# Altium footprint library RoBeast_PCB_Library.PcbLib: 71 footprints (part 3 of 5)
Each footprint in its own frame and in the unit in brackets; x right, y up, seen from the top. Pads: shape width x height; smd on the part's side, far side on the other; paste and mask are expansions set on the pad; w line width, h text height; cw(c..) or ccw(c..) is an arc to the next point about the centre after c.
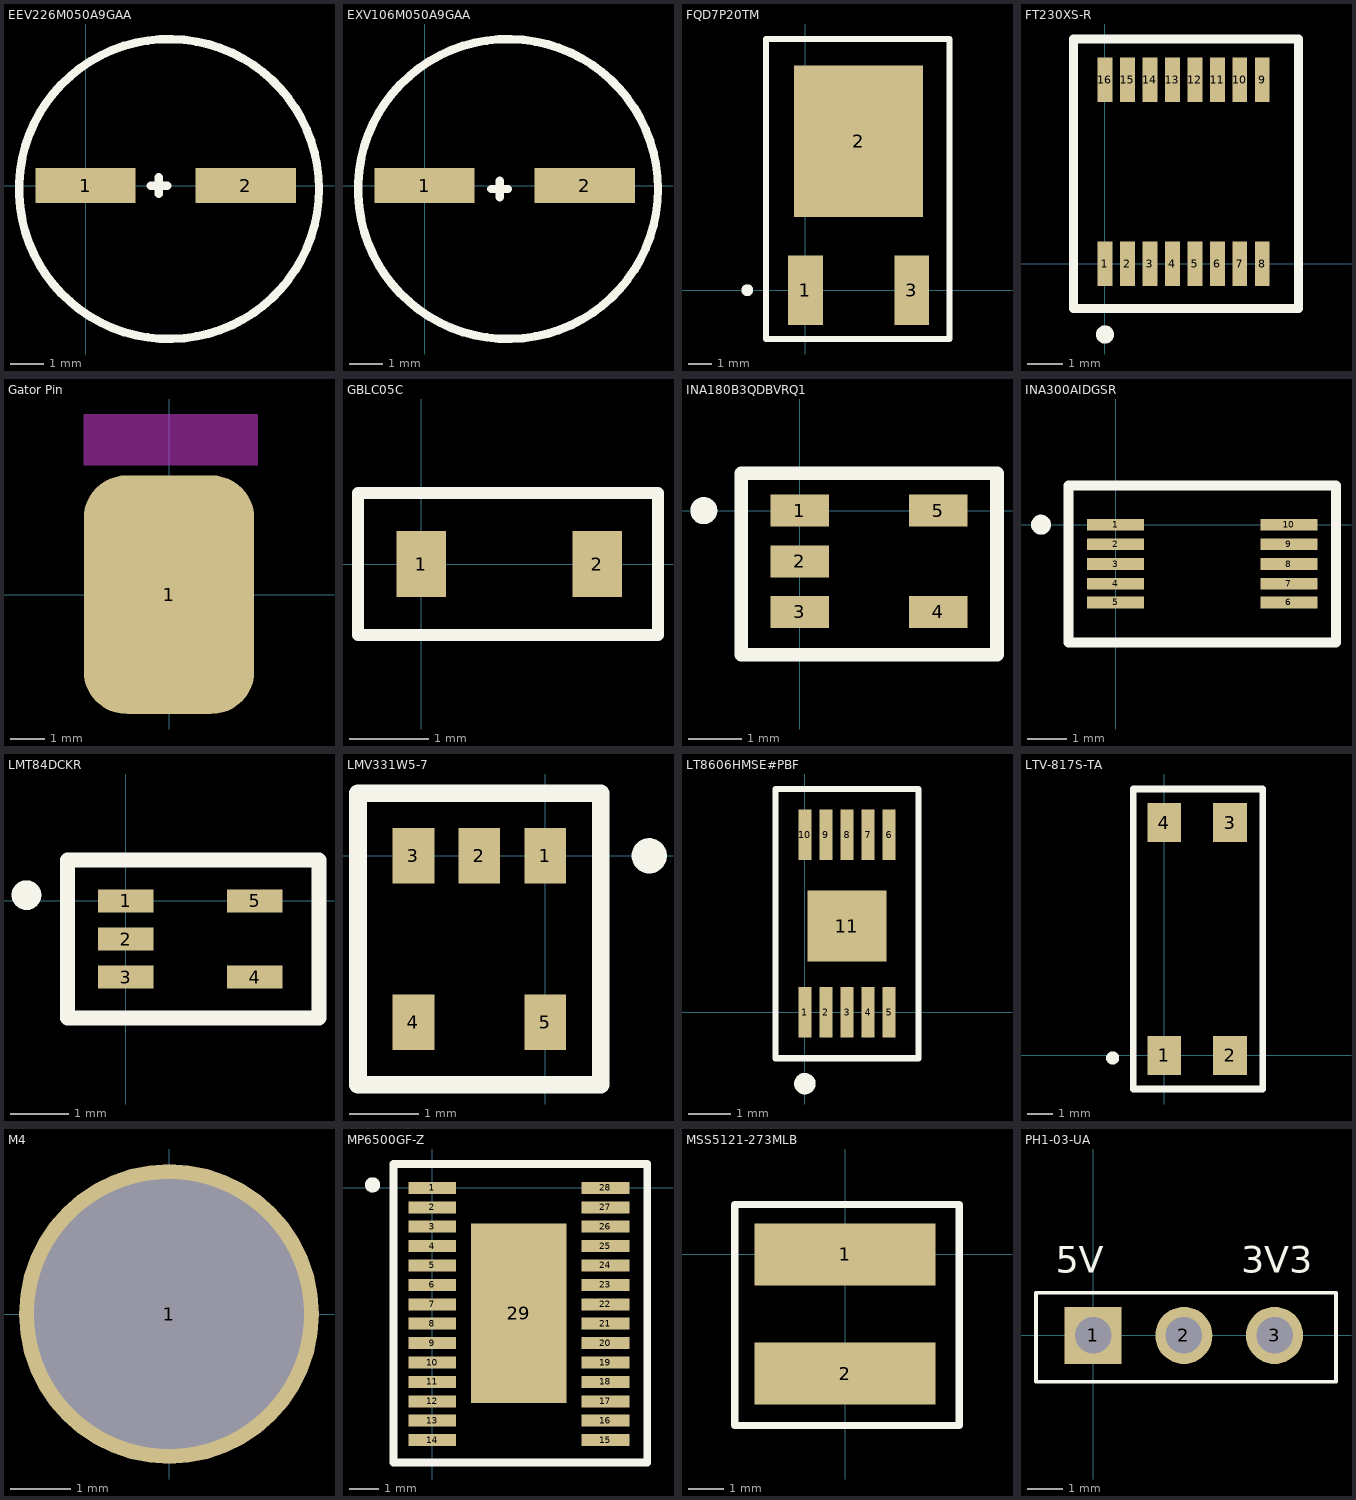
[diagram p2: the footprints below, top view; thin cyan lines are the x and y axes]

## EEV226M050A9GAA [mm]
pads (2):
  rect 3x1.05 smd: 1(0,0) 2(4.8,0)
Top Overlay:
  circle w0.254: c2.5,-0.1 r4.494
  lines w0.254: 1.95,0 2.45,0 ; 2.2,-0.25 2.2,0.25
3D body "EEV226M050A9GAA.step": height 5.36, standoff -0.3, extent -1.414,-3.377 6.186,3.423

## EXV106M050A9GAA [mm]
pads (2):
  rect 3x1.05 smd: 1(0,0) 2(4.8,0)
Top Overlay:
  circle w0.254: c2.5,-0.1 r4.494
  lines w0.254: 2,-0.1 2.5,-0.1 ; 2.25,-0.35 2.25,0.15
3D body "EXV106M050A9GAA.step": height 5.66, standoff 0, extent -1.4,-3.4 6.2,3.4

## FQD7P20TM [mm]
pads (3):
  rect 1.5x3 smd: 1(0,0) 3(4.572,0)
  rect 5.55x6.5 smd: 2(2.286,6.4)
Top Overlay:
  circle w0.254: c-2.5,0 r0.127
  lines w0.254: -1.7,-2.1 6.2,-2.1 6.2,10.8 -1.7,10.8 -1.7,-2.1
3D body "DPAK-4_6P22X6P73_ONS.step": height 2.49, standoff 0.05, extent -1.066,-1.303 5.666,10.191

## FT230XS-R [mm]
pads (16):
  rect 0.42x1.25 smd mask+0.051: 1(0,0) 2(0.635,0) 3(1.27,0) 4(1.905,0) 5(2.54,0) 6(3.175,0) 7(3.81,0) 8(4.445,0) 9(4.445,5.2) 10(3.81,5.2) 11(3.175,5.2) 12(2.54,5.2) 13(1.905,5.2) 14(1.27,5.2) 15(0.635,5.2) 16(0,5.2)
Top Overlay:
  circle w0.254: c0,-2 r0.127
  lines w0.254: -0.889,-1.27 5.469,-1.27 5.469,6.35 -0.889,6.35 -0.889,-1.27
3D body "SOIC_30XS-R_FTD.step": height 1.76, standoff 0, extent -0.252,-0.549 4.752,5.649

## Gator Pin [mm]
pads (1):
  rrect50% 5x7 smd: 1(0,0)
Keep-Out Layer:
  board cut-out: -2.5,3.8 -2.5,5.3 2.6,5.3 2.6,3.8

## GBLC05C [mm]
pads (2):
  rect 0.63x0.83 smd: 1(0,0) 2(2.23,0)
Top Overlay:
  lines w0.15: -0.8,-0.9 -0.8,0.9 3,0.9 3,-0.9 -0.8,-0.9
3D body "ZMV829BTA.STEP": height 1.2, standoff 0, extent -0.15,-0.65 2.35,0.65

## INA180B3QDBVRQ1 [mm]
pads (5):
  rect 1.1x0.6 smd mask+0.102: 1(0,0) 2(0,-0.95) 3(0,-1.9) 4(2.6,-1.9) 5(2.6,0)
Top Overlay:
  circle w0.254: c-1.8,0 r0.127
  lines w0.254: -1.1,-2.7 3.7,-2.7 3.7,0.7 -1.1,0.7 -1.1,-2.7
3D body "DBV0005A.stp": height 1.2, standoff 0, extent -0.073,-2.399 2.727,0.501

## INA300AIDGSR [mm]
pads (10):
  rect 1.45x0.3 smd mask+0.051: 1(0,0) 2(0,-0.5) 3(0,-1) 4(0,-1.5) 5(-0.002,-1.976) 6(4.4,-1.976) 7(4.4,-1.5) 8(4.4,-1) 9(4.4,-0.5) 10(4.4,0)
Top Overlay:
  circle w0.254: c-1.9,0 r0.127
  lines w0.254: -1.2,-3 -1.2,1 5.6,1 5.6,-3 -1.2,-3
3D body "DGS0010A.stp": height 1.06, standoff -0.04, extent -0.238,-2.493 4.687,0.507

## LMT84DCKR [mm]
pads (5):
  rect 0.95x0.4 smd mask+0.07: 1(0,0) 2(0,-0.65) 3(0,-1.3) 4(2.2,-1.3) 5(2.2,0)
Top Overlay:
  circle w0.254: c-1.7,0.1 r0.127
  lines w0.254: -1,-2 -1,0.7 3.3,0.7 3.3,-2 -1,-2
3D body "DCK0005A.stp": height 1, standoff 0, extent 0.049,-1.654 2.149,0.346

## LMV331W5-7 [mm]
pads (5):
  rect 0.6x0.8 smd: 1(0,0) 2(-0.95,0) 3(-1.9,0) 4(-1.9,-2.4) 5(0,-2.4)
Top Overlay:
  circle w0.254: c1.5,0 r0.127
  lines w0.254: -2.7,-3.3 0.8,-3.3 0.8,0.9 -2.7,0.9 -2.7,-3.3
3D body "SOT25_DIO.step": height 1.45, standoff 0, extent -2.48,-2.731 0.62,0.269

## LT8606HMSE#PBF [mm]
pads (11):
  rect 0.305x1.2 smd mask+0.045: 1(0,0) 2(0.5,0) 3(1,0) 4(1.5,0) 5(2,0) 6(2,4.211) 7(1.5,4.211) 8(1,4.211) 9(0.5,4.211) 10(0,4.211)
  rect 1.88x1.68 smd mask+0.049: 11(0.998,2.044)
Top Overlay:
  circle w0.254: c0,-1.7 r0.127
  lines w0.15: -0.7,-1.1 -0.7,5.3 2.7,5.3 2.7,-1.1 -0.7,-1.1
3D body "MSE_10_ADI.step": height 1.7, standoff 0, extent -0.498,-0.427 2.5,4.627

## LTV-817S-TA [mm]
pads (4):
  rect 1.3x1.5 smd: 1(0,0) 2(2.54,0) 3(2.54,9) 4(0,9)
Top Overlay:
  circle w0.254: c-2,-0.1 r0.127
  lines w0.254: -1.2,-1.3 -1.2,10.3 3.8,10.3 3.8,-1.3 -1.2,-1.3
3D body "PC817XI.STEP": height 4, standoff 0, extent -1.023,-0.333 3.557,9.417

## M4 [mm]
pads (1):
  round 5 hole 4.5: 1(0,0)
3D body "???_83.STEP": height 4, standoff -18, extent -3.6,-3.4 3.376,3.6

## MP6500GF-Z [mm]
pads (29):
  rect 1.6x0.4 smd mask+0.051: 1(0,0) 2(0,-0.65) 3(0,-1.3) 4(0,-1.95) 5(0,-2.6) 6(0,-3.25) 7(0,-3.9) 8(0,-4.55) 9(0,-5.2) 10(0,-5.85) 11(0,-6.5) 12(0,-7.15) 13(0,-7.8) 14(0,-8.45) 15(5.8,-8.45) 16(5.8,-7.8) 17(5.8,-7.15) 18(5.8,-6.5) 19(5.8,-5.85) 20(5.8,-5.2) 21(5.8,-4.55) 22(5.8,-3.9) 23(5.8,-3.25) 24(5.8,-2.6) 25(5.8,-1.95) 26(5.8,-1.3) 27(5.8,-0.65) 28(5.8,0)
  rect 3.2x6 smd mask+0.051: 29(2.9,-4.2)
Top Overlay:
  circle w0.254: c-2,0.1 r0.127
  lines w0.254: -1.3,-9.2 7.2,-9.2 7.2,0.8 -1.3,0.8 -1.3,-9.2
3D body "HTSSOP28_4P4X9P7_TEX.step": height 1.2, standoff 0, extent -0.199,-9.051 5.999,0.651

## MSS5121-273MLB [mm]
pads (2):
  rect 5.08x1.74 smd: 1(0,0) 2(0,-3.34)
Top Overlay:
  lines w0.2: -3.1,-4.8 -3.1,1.4 3.2,1.4 3.2,-4.8 -3.1,-4.8
3D body "LQH5BPB1R0NT0L.STEP": height 2.2, standoff 0, extent -2.5,-4.2 2.5,0.8

## PH1-03-UA [mm]
pads (3):
  rect 1.6x1.6 hole 1.02: 1(0,0)
  round 1.6 hole 1.02: 2(2.54,0) 3(5.08,0)
Top Overlay:
  lines w0.1: -1.6,-1.3 6.8,-1.3 6.8,1.2 -1.6,1.2 -1.6,-1.3
  text "5V" at -1.05,1.75 h0.75
  text "3V3" at 4.15,1.75 h0.75
3D body "PH1-03-UA.STEP": height 8.25, standoff -3.3, extent -1.214,-1.3 6.414,1.2